# Altium footprint library 电感.PcbLib: 53 footprints (part 1 of 4)
Each footprint in its own frame and in the unit in brackets; x right, y up, seen from the top. Pads: shape width x height; smd on the part's side, far side on the other; paste and mask are expansions set on the pad; w line width, h text height; cw(c..) or ccw(c..) is an arc to the next point about the centre after c.
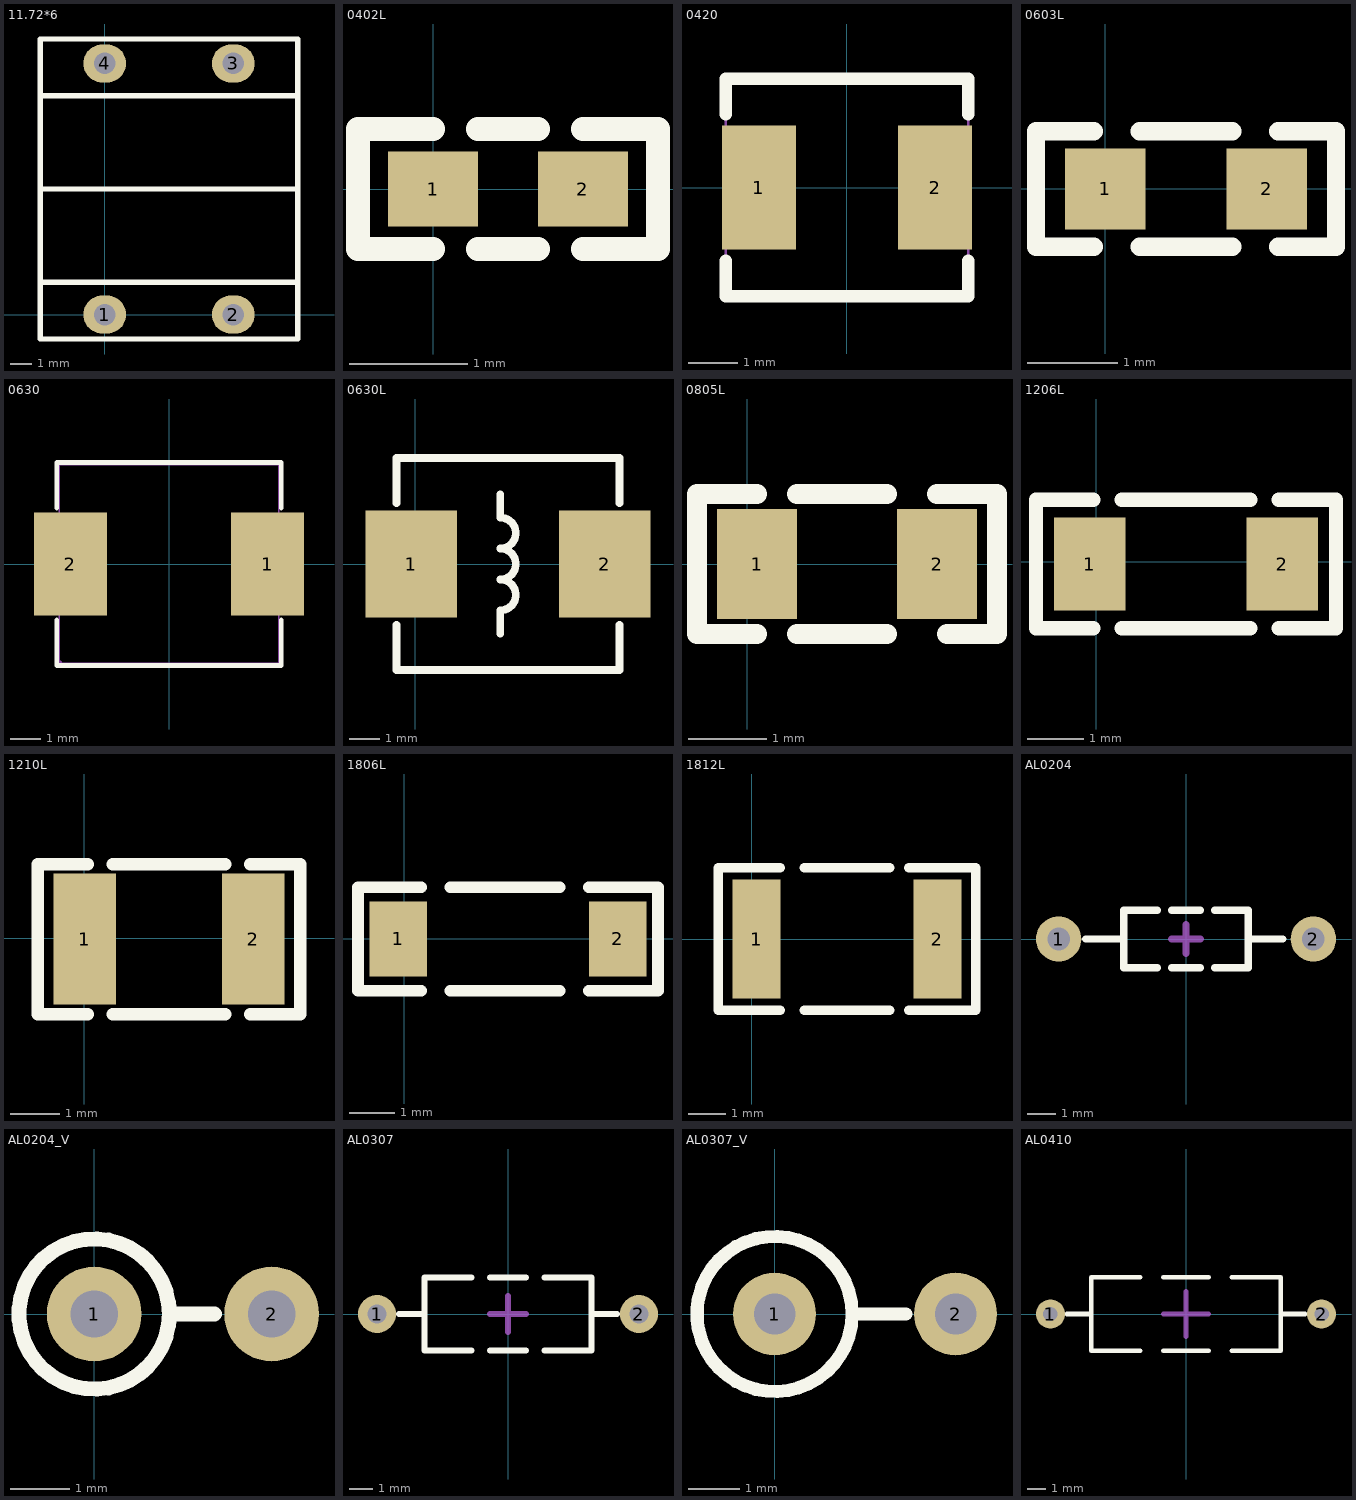
[diagram p0: the footprints below, top view; thin cyan lines are the x and y axes]

## 11.72*6 [mm]
pads (4):
  oval 2x1.778 hole 1: 1(0,0) 2(6,0) 3(6,11.72) 4(0,11.72)
Top Overlay:
  lines w0.254: -3,1.5 9,1.5 ; -3,5.86 9,5.86 ; -3,10.22 9,10.22 ; -3,-1.14 9,-1.14 9,12.86 -3,12.86 -3,-1.14

## 0402L [mil]
pads (2):
  rect 30x25 smd: 1(0,0) 2(50,0)
Top Overlay:
  lines w8: 0,-20 -25,-20 -25,20 -15,20 0,20 ; 15,-20 35,-20 ; 15,20 35,20 ; 50,-20 75,-20 75,20 50,20
3D body "0402L.STEP": height 19.68, standoff 0, extent 5.31,-9.68 44.69,10

## 0420 [mm]
pads (2):
  rect 1.5x2.5 smd paste+0 mask+0.051: 1(-1.78,0) 2(1.78,0)
Top Overlay:
  lines w0.254: -2.45,-1.481 -2.45,-2.2 2.45,-2.2 2.45,-1.481 ; -2.45,1.481 -2.45,2.2 2.45,2.2 2.45,1.481
Mechanical 15:
  region: -2.39,-2.2 -2.39,-2.175 -2.425,-2.14 -2.475,-2.14 -2.51,-2.175 -2.51,-2.2 -2.51,-2.225 -2.475,-2.26 -2.425,-2.26 -2.39,-2.225 -2.39,-2.2
  region: 1.45,0.75 2.45,0.75 2.45,-0.75 1.45,-0.75
  region: -2.45,0.75 -1.45,0.75 -1.45,-0.75 -2.45,-0.75
  lines w0.051: -2.45,-2.2 2.45,-2.2 2.45,2.2 -2.45,2.2 -2.45,-2.2

## 0603L [mil] "小功率贴片电感"
pads (2):
  rect 35x35 smd: 1(0,0) 2(70,0)
Top Overlay:
  lines w8: -5,-25 -30,-25 -30,25 -5,25 ; 15,-25 55,-25 ; 15,25 55,25 ; 75,-25 100,-25 100,25 75,25
3D body "0603L.STEP": height 31.5, standoff 0, extent 3.5,-16.5 66.5,15

## 0630 [mm]
pads (2):
  rect 2.424x3.42 smd paste+0 mask+0.051: 1(3.278,0) 2(-3.278,0)
Top Overlay:
  lines w0.152: -3.726,-1.862 -3.726,-3.376 3.726,-3.376 3.726,-1.862 ; -3.726,1.862 -3.726,3.376 3.726,3.376 3.726,1.862
Mechanical 15:
  region: -3.56,-3.27 -3.56,-3.245 -3.595,-3.21 -3.645,-3.21 -3.68,-3.245 -3.68,-3.27 -3.68,-3.295 -3.645,-3.33 -3.595,-3.33 -3.56,-3.295 -3.56,-3.27
  region: -3.65,-1.5 -3.65,1.5 -2.15,1.5 -2.15,-1.5
  region: 3.65,-1.5 3.65,1.5 2.15,1.5 2.15,-1.5
  lines w0.051: -3.65,-3.3 -3.65,3.3 3.65,3.3 3.65,-3.3 -3.65,-3.3

## 0630L [mm]
pads (2):
  rect 3x3.5 smd: 1(-0.127,0) 2(6.223,0)
Top Overlay:
  lines w0.254: -0.61,-2.007 -0.61,-3.48 6.706,-3.48 6.706,-2.007 ; -0.61,2.007 -0.61,3.48 6.706,3.48 6.706,2.007 ; 2.794,-2.286 2.794,-1.524 ccw(c2.794,-1.016) 2.794,-0.508 ccw(c2.794,0) 2.794,0.508 ccw(c2.794,1.016) 2.794,1.524 2.794,2.286
3D body "SMD0630L.STEP": height 3.05, standoff 0.02, extent -0.554,-3.046 6.396,3.554

## 0805L [mil] "小功率贴片电感"
pads (2):
  rect 40x55 smd: 1(5,0) 2(95,0)
Top Overlay:
  lines w10: 5,-35 -25,-35 -25,35 5,35 ; 25,-35 70,-35 ; 25,35 70,35 ; 95,35 125,35 125,-35 100,-35
3D body "0805L.STEP": height 35.43, standoff 0, extent 15,-23.62 93.74,23.62

## 1206L [mil] "小功率贴片电感"
pads (2):
  rect 50x65 smd: 1(-4.51,-1.5) 2(130.49,-1.5)
Top Overlay:
  lines w10: -2.01,-46.5 -42.01,-46.5 -42.01,43.5 -2.01,43.5 ; 17.99,-46.5 107.99,-46.5 ; 17.99,43.5 107.99,43.5 ; 127.99,-46.5 167.99,-46.5 167.99,43.5 127.99,43.5
3D body "1206L.STEP": height 35.43, standoff 0, extent 0,-31.5 125.98,31.5

## 1210L [mm] "小功率贴片电感"
pads (2):
  rect 1.27x2.667 smd: 1(0.012,-0.02) 2(3.441,-0.02)
Top Overlay:
  lines w0.254: 0.076,-1.544 -0.94,-1.544 -0.94,1.504 0.076,1.504 ; 0.584,-1.544 2.87,-1.544 ; 0.584,1.504 2.87,1.504 ; 3.378,-1.544 4.394,-1.544 4.394,1.504 3.378,1.504
3D body "1210L.STEP": height 1.3, standoff 0, extent 0,-1.25 3.2,1.25

## 1806L [mil] "小功率贴片电感"
pads (2):
  rect 50x65 smd: 1(-5,0) 2(185,0)
Top Overlay:
  lines w10: 15,-45 -40,-45 -40,45 15,45 ; 40,-45 135,-45 ; 40,45 135,45 ; 160,-45 220,-45 220,-40 220,-15 220,45 160,45
3D body "1806.STEP": height 62.99, standoff -0.19, extent 1.42,-31.5 178.58,31.5

## 1812L [mil] "小功率贴片电感"
pads (2):
  rect 50x125 smd: 1(5,0) 2(195,0)
Top Overlay:
  lines w10: 30,-75 -35,-75 -35,75 30,75 ; 55,-75 145,-75 ; 55,75 145,75 ; 165,-75 235,-75 235,75 165,75
3D body "1812L.STEP": height 59.06, standoff 0, extent 15,-62.99 192.16,62.99

## AL0204 [mm] "9*2*4mm（脚距，直径，长度）"
pads (2):
  round 1.6 hole 0.8: 1(-4.5,0) 2(4.5,0)
Top Overlay:
  lines w0.254: -3.556,0 -2.2,0 ; -1.016,-1.016 -2.2,-1.016 -2.2,1.016 -1.016,1.016 ; -0.508,-1.016 0.508,-1.016 ; -0.508,1.016 0.508,1.016 ; 1.016,-1.016 2.2,-1.016 2.2,1.016 1.016,1.016 ; 2.2,0 3.429,0
Mechanical 15:
  lines w0.254: -0.508,0 0.508,0 ; 0,-0.508 0,0.508
3D body "AL0204.STEP": height 2.07, standoff -3.5, extent -4.75,-1.016 4.75,1.017

## AL0204_V [mm] "3*2*4mm（脚距，直径，长度）"
pads (2):
  round 1.6 hole 0.8: 1(0,0) 2(3,0)
Top Overlay:
  circle w0.254: c0,0 r1.27
  lines w0.254: 1.27,0 2.032,0
3D body "AL0204_V.STEP": height 5.48, standoff -3.5, extent -1.084,-1.009 3.175,1.009

## AL0307 [mm] "11*3*7mm（脚距，直径，长度）"
pads (2):
  round 1.6 hole 0.8: 1(-5.5,0) 2(5.5,0)
Top Overlay:
  lines w0.254: -4.572,0 -3.5,0 ; -1.524,-1.524 -3.5,-1.524 -3.5,1.524 -1.524,1.524 ; -0.762,-1.524 0.762,-1.524 ; -0.762,1.524 0.762,1.524 ; 1.524,-1.524 3.5,-1.524 3.5,1.524 1.524,1.524 ; 3.5,0 4.572,0
Mechanical 15:
  lines w0.254: -0.762,0 0.762,0 ; 0,-0.762 0,0.762
3D body "AL0307.STEP": height 3.06, standoff -3.5, extent -5.715,-1.508 5.835,1.508

## AL0307_V [mm] "3.5*3*7mm（脚距，直径，长度）"
pads (2):
  round 1.6 hole 0.8: 1(0,0) 2(3.5,0)
Top Overlay:
  circle w0.254: c0,0 r1.5
  lines w0.254: 1.5,0 2.54,0
3D body "AL0307_V.STEP": height 8.81, standoff -3.5, extent -1.487,-1.524 3.81,1.514

## AL0410 [mm] "15*4*10.5mm（脚距，直径，长度）"
pads (2):
  round 1.6 hole 0.8: 1(-7.5,0) 2(7.5,0)
Top Overlay:
  lines w0.254: -6.604,0 -5.25,0 ; -2.54,-2.032 -5.25,-2.032 -5.25,2.032 -2.54,2.032 ; -1.27,-2.032 1.27,-2.032 ; -1.27,2.032 1.27,2.032 ; 2.54,-2.032 5.25,-2.032 5.25,2.032 2.54,2.032 ; 5.25,0 6.604,0
Mechanical 15:
  lines w0.254: -1.27,0 1.27,0 ; 0,-1.27 0,1.27
3D body "AL0410.STEP": height 4.06, standoff -3.5, extent -7.747,-2.005 7.803,2.005